# Altium footprint library Connectors - Terminal Blocks - Headers Plugs and Sockets.PcbLib: 19 footprints (part 1 of 2)
Each footprint in its own frame and in the unit in brackets; x right, y up, seen from the top. Pads: shape width x height; smd on the part's side, far side on the other; paste and mask are expansions set on the pad; w line width, h text height; cw(c..) or ccw(c..) is an arc to the next point about the centre after c.
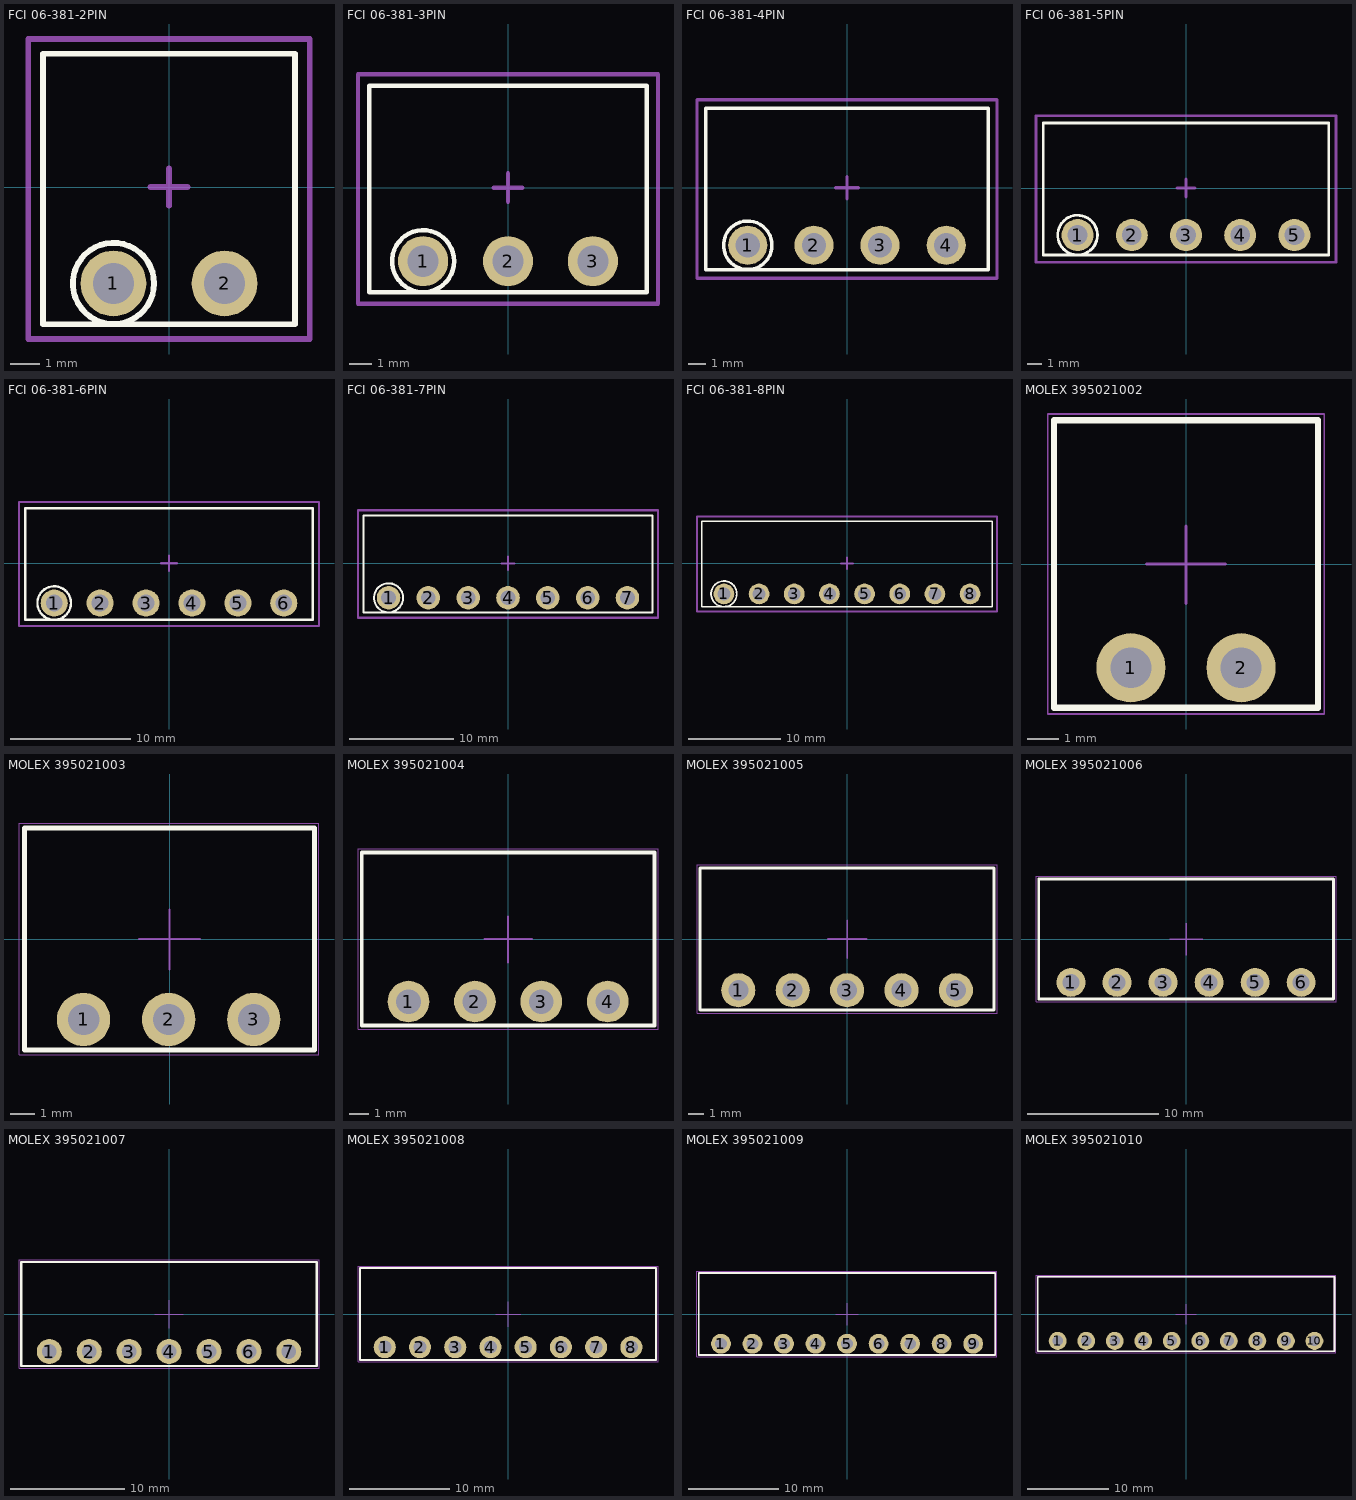
[diagram p0: the footprints below, top view; thin cyan lines are the x and y axes]

## FCI 06-381-2PIN [mm] "FCI Pluggable Terminal Block"
height 7
pads (2):
  round 2.25 hole 1.4: 1(-1.905,-3.302) 2(1.905,-3.302)
Top Overlay:
  circle w0.2: c-1.905,-3.302 r1.393
  lines w0.2: -4.318,-4.699 4.318,-4.699 4.318,4.572 -4.318,4.572 -4.318,-4.699
Mechanical 15:
  lines w0.2: -0.635,0 0.635,0 ; 0,-0.635 0,0.635 ; -4.826,-5.207 4.826,-5.207 4.826,5.08 -4.826,5.08 -4.826,-5.207
3D body "FCI 06-381 2Pos.STEP": height 7.6, standoff -3.52, extent -4.405,-4.699 4.405,4.501

## FCI 06-381-3PIN [mm] "FCI Pluggable Terminal Block"
height 7
pads (3):
  round 2.25 hole 1.4: 1(-3.81,-3.302) 2(0,-3.302) 3(3.81,-3.302)
Top Overlay:
  circle w0.2: c-3.81,-3.302 r1.393
  lines w0.2: -6.223,-4.699 -6.223,4.572 6.223,4.572 6.223,-4.699 -6.223,-4.699
Mechanical 15:
  lines w0.2: -0.635,0 0.635,0 ; 0,-0.635 0,0.635 ; -6.731,-5.207 -6.731,5.08 6.731,5.08 6.731,-5.207 -6.731,-5.207
3D body "FCI 06-381 3Pos.STEP": height 7.6, standoff -3.52, extent -6.31,-4.699 6.31,4.501

## FCI 06-381-4PIN [mm] "FCI Pluggable Terminal Block"
height 7
pads (4):
  round 2.25 hole 1.4: 1(-5.715,-3.302) 2(-1.905,-3.302) 3(1.905,-3.302) 4(5.715,-3.302)
Top Overlay:
  circle w0.2: c-5.715,-3.302 r1.393
  lines w0.2: -8.128,-4.699 -8.128,4.572 8.128,4.572 8.128,-4.699 -8.128,-4.699
Mechanical 15:
  lines w0.2: -0.635,0 0.635,0 ; 0,-0.635 0,0.635 ; -8.636,-5.207 -8.636,5.08 8.636,5.08 8.636,-5.207 -8.636,-5.207
3D body "FCI 06-381 4Pos.STEP": height 7.6, standoff -3.52, extent -8.215,-4.699 8.215,4.501

## FCI 06-381-5PIN [mm] "FCI Pluggable Terminal Block"
height 7
pads (5):
  round 2.25 hole 1.4: 1(-7.62,-3.302) 2(-3.81,-3.302) 3(0,-3.302) 4(3.81,-3.302) 5(7.62,-3.302)
Top Overlay:
  circle w0.2: c-7.62,-3.302 r1.393
  lines w0.2: -10.033,-4.699 10.033,-4.699 10.033,4.572 -10.033,4.572 -10.033,-4.699
Mechanical 15:
  lines w0.2: -0.635,0 0.635,0 ; 0,-0.635 0,0.635 ; -10.541,-5.207 10.541,-5.207 10.541,5.08 -10.541,5.08 -10.541,-5.207
3D body "FCI 06-381 5Pos.STEP": height 7.6, standoff -3.52, extent -10.12,-4.699 10.12,4.501

## FCI 06-381-6PIN [mm] "FCI Pluggable Terminal Block"
height 7
pads (6):
  round 2.25 hole 1.4: 1(-9.525,-3.302) 2(-5.715,-3.302) 3(-1.905,-3.302) 4(1.905,-3.302) 5(5.715,-3.302) 6(9.525,-3.302)
Top Overlay:
  circle w0.2: c-9.525,-3.302 r1.393
  lines w0.2: -11.938,-4.699 11.938,-4.699 11.938,4.572 -11.938,4.572 -11.938,-4.699
Mechanical 15:
  lines w0.2: -0.635,0 0.635,0 ; 0,-0.635 0,0.635 ; -12.446,-5.207 12.446,-5.207 12.446,5.08 -12.446,5.08 -12.446,-5.207
3D body "FCI 06-381 6Pos.STEP": height 7.6, standoff -3.52, extent -12.025,-4.699 12.025,4.501

## FCI 06-381-7PIN [mm] "FCI Pluggable Terminal Block"
height 7
pads (7):
  round 2.25 hole 1.4: 1(-11.43,-3.302) 2(-7.62,-3.302) 3(-3.81,-3.302) 4(0,-3.302) 5(3.81,-3.302) 6(7.62,-3.302) 7(11.43,-3.302)
Top Overlay:
  circle w0.2: c-11.43,-3.302 r1.393
  lines w0.2: -13.843,-4.699 -13.843,4.572 13.843,4.572 13.843,-4.699 -13.843,-4.699
Mechanical 15:
  lines w0.2: -0.635,0 0.635,0 ; 0,-0.635 0,0.635 ; -14.351,-5.207 -14.351,5.08 14.351,5.08 14.351,-5.207 -14.351,-5.207
3D body "FCI 06-381 7Pos.STEP": height 7.6, standoff -3.52, extent -13.93,-4.699 13.93,4.501

## FCI 06-381-8PIN [mm] "FCI Pluggable Terminal Block"
height 7
pads (8):
  round 2.25 hole 1.4: 1(-13.335,-3.302) 2(-9.525,-3.302) 3(-5.715,-3.302) 4(-1.905,-3.302) 5(1.905,-3.302) 6(5.715,-3.302) 7(9.525,-3.302) 8(13.335,-3.302)
Top Overlay:
  circle w0.2: c-13.335,-3.302 r1.393
  lines w0.2: -15.748,-4.699 15.748,-4.699 15.748,4.572 -15.748,4.572 -15.748,-4.699
Mechanical 15:
  lines w0.2: -0.635,0 0.635,0 ; 0,-0.635 0,0.635 ; -16.256,-5.207 16.256,-5.207 16.256,5.08 -16.256,5.08 -16.256,-5.207
3D body "FCI 06-381 8Pos.STEP": height 7.6, standoff -3.52, extent -15.835,-4.699 15.835,4.501

## MOLEX 395021002 [mil] "2 Position Terminal Block Header, Male Pins, 3.5mm Pitch,4.2x9.2mm Body, 90°, Right Angle, THT"
height 287.4
pads (2):
  round 86.61 hole 51: 1(-69,-130) 2(69,-130)
Top Overlay:
  lines w7.87: -165.35,-180 -165.35,180 165.35,180 165.35,-180 -165.35,-180
Mechanical 13:
  lines w3.94: -165.5,-180 165.35,-180 165.35,180 -165.5,180 ; -165.35,-180 -165.35,180
Mechanical 15:
  lines w1.97: -173.23,-187.87 -173.23,187.87 173.23,187.87 173.23,-187.87 -173.23,-187.87
  lines w3.94: -49.21,0 0,0 ; 0,-49.21 0,0 ; 0,47.24 0,0 ; 49.21,0 0,0
3D body "Molex - 395021002.step": height 280, standoff -140, extent -166,-180 166,180

## MOLEX 395021003 [mm] "3 Position Terminal Block Header, Male Pins, 3.5mm Pitch,11.94mmx9.2mm Body, 90°, Right Angle, THT"
height 7.3
pads (3):
  round 2.2 hole 1.295: 1(-3.542,-3.315) 2(-0.036,-3.315) 3(3.469,-3.315)
Top Overlay:
  lines w0.2: -5.969,-4.572 -5.969,4.572 5.969,4.572 5.969,-4.572 -5.969,-4.572
Mechanical 13:
  lines w0.1: -5.969,-4.572 5.969,-4.572 5.969,4.572 -5.969,4.572 -5.969,-4.572
Mechanical 15:
  lines w0.05: -6.2,-4.772 -6.2,4.772 6.157,4.772 6.157,-4.772 -6.2,-4.772
  lines w0.1: -1.25,0 0,0 ; 0,-1.25 0,0 ; 0,1.2 0,0 ; 1.25,0 0,0
3D body "Molex - 395021003 v1.step": height 7.11, standoff -3.56, extent -5.969,-4.572 5.969,4.572

## MOLEX 395021004 [mil] "4 Position Terminal Block Header, Male Pins, 3.5mm Pitch,15.44mmx9.2mm Body, 90°, Right Angle, THT"
height 287.4
pads (4):
  round 86.61 hole 51: 1(-207,-130) 2(-69,-130) 3(69,-130) 4(207,-130)
Top Overlay:
  lines w7.87: -304,-180 304,-180 304,180 -304,180 -304,-180
Mechanical 13:
  lines w3.94: -304,-180 -304,180 304,180 304,-180 -304,-180
Mechanical 15:
  lines w1.97: -311.89,-187.87 311.39,-187.87 311.39,187.87 -311.89,187.87 -311.89,-187.87
  lines w3.94: -49.21,0 0,0 ; 0,-49.21 0,0 ; 0,47.24 0,0 ; 49.21,0 0,0
3D body "Molex - 395021004 v1.step": height 280, standoff -140, extent -304,-180 304,180

## MOLEX 395021005 [mm] "5 Position Terminal Block Header, Male Pins, 3.5mm Pitch,18.95mmx9.2mm Body, 90°, Right Angle, THT"
height 7.3
pads (5):
  round 2.2 hole 1.295: 1(-7.011,-3.302) 2(-3.506,-3.302) 3(0,-3.302) 4(3.505,-3.302) 5(7.01,-3.302)
Top Overlay:
  lines w0.2: -9.474,-4.572 -9.474,4.572 9.475,4.572 9.475,-4.572 -9.474,-4.572
Mechanical 13:
  lines w0.1: -9.474,-4.572 9.475,-4.572 9.475,4.572 -9.474,4.572 -9.474,-4.572
Mechanical 15:
  lines w0.05: -9.674,-4.772 -9.674,4.772 9.662,4.772 9.662,-4.772 -9.674,-4.772
  lines w0.1: -1.25,0 0,0 ; 0,-1.25 0,0 ; 0,1.2 0,0 ; 1.25,0 0,0
3D body "Molex - 395021005 v1.step": height 7.11, standoff -3.56, extent -9.474,-4.572 9.475,4.572

## MOLEX 395021006 [mil] "6 Position Terminal Block Header, Male Pins, 3.5mm Pitch,22.45mmx9.2mm Body, 90°, Right Angle, THT"
height 287.4
pads (6):
  round 86.61 hole 51: 1(-345,-130) 2(-207,-130) 3(-69,-130) 4(69,-130) 5(207,-130) 6(345,-130)
Top Overlay:
  lines w7.87: -442,-180 442,-180 442,180 -442,180 -442,-180
Mechanical 13:
  lines w3.94: -442,-180 -442,180 442,180 442,-180 -442,-180
Mechanical 15:
  lines w1.97: -449.88,-187.87 449.39,-187.87 449.39,187.87 -449.88,187.87 -449.88,-187.87
  lines w3.94: -49.21,0 0,0 ; 0,-49.21 0,0 ; 0,47.24 0,0 ; 49.21,0 0,0
3D body "Molex - 395021006 v1.step": height 280, standoff -140, extent -442,-180 442,180

## MOLEX 395021007 [mil] "7 Position Terminal Block Header, Male Pins, 3.5mm Pitch,25.959mmx9.2mm Body, 90°, Right Angle, THT"
height 287.4
pads (7):
  round 86.61 hole 51: 1(-414,-130) 2(-276,-130) 3(-138,-130) 4(0,-130) 5(138,-130) 6(276,-130) 7(414,-130)
Top Overlay:
  lines w7.87: -511,-180 511,-180 511,180 -511,180 -511,-180
Mechanical 13:
  lines w3.94: -511,-180 -511,180 511,180 511,-180 -511,-180
Mechanical 15:
  lines w1.97: -518.86,-187.87 518.39,-187.87 518.39,187.87 -518.86,187.87 -518.86,-187.87
  lines w3.94: -49.21,0 0,0 ; 0,-49.21 0,0 ; 0,47.24 0,0 ; 49.21,0 0,0
3D body "Molex - 395021007 v1.step": height 280, standoff -140, extent -511,-180 511,180

## MOLEX 395021008 [mil] "8 Position Terminal Block Header, Male Pins, 3.5mm Pitch,29.46mmx9.2mm Body, 90°, Right Angle, THT"
height 287.4
pads (8):
  round 86.61 hole 51: 1(-483,-130) 2(-345,-130) 3(-207,-130) 4(-69,-130) 5(69,-130) 6(207,-130) 7(345,-130) 8(483,-130)
Top Overlay:
  lines w7.87: -580,-180 -580,180 580,180 580,-180 -580,-180
Mechanical 13:
  lines w3.94: -580,-180 580,-180 580,180 -580,180 -580,-180
Mechanical 15:
  lines w1.97: -587.87,-187.87 -587.87,187.87 587.39,187.87 587.39,-187.87 -587.87,-187.87
  lines w3.94: -49.21,0 0,0 ; 0,-49.21 0,0 ; 0,47.24 0,0 ; 49.21,0 0,0
3D body "Molex - 395021008 v1.step": height 280, standoff -140, extent -580,-180 580,180

## MOLEX 395021009 [mil] "9 Position Terminal Block Header, Male Pins, 3.5mm Pitch,32.97mmx9.2mm Body, 90°, Right Angle, THT"
height 287.4
pads (9):
  round 86.61 hole 51: 1(-552,-130) 2(-414,-130) 3(-276,-130) 4(-138,-130) 5(0,-130) 6(138,-130) 7(276,-130) 8(414,-130) 9(552,-130)
Top Overlay:
  lines w7.87: -649,-180 649,-180 649,180 -649,180 -649,-180
Mechanical 13:
  lines w3.94: -649,-180 -649,180 649,180 649,-180 -649,-180
Mechanical 15:
  lines w1.97: -656.89,-187.87 656.39,-187.87 656.39,187.87 -656.89,187.87 -656.89,-187.87
  lines w3.94: -49.21,0 0,0 ; 0,-49.21 0,0 ; 0,47.24 0,0 ; 49.21,0 0,0
3D body "Molex - 395021009 v1.step": height 280, standoff -140, extent -649,-180 649,180

## MOLEX 395021010 [mil] "10 Position Terminal Block Header, Male Pins, 3.5mm Pitch,36.47mmx9.2mm Body, 90°, Right Angle, THT"
height 287.4
pads (10):
  round 86.61 hole 51: 1(-621,-130) 2(-483,-130) 3(-345,-130) 4(-207,-130) 5(-69,-130) 6(69,-130) 7(207,-130) 8(345,-130) 9(483,-130) 10(621,-130)
Top Overlay:
  lines w7.87: -718,-180 718,-180 718,180 -718,180 -718,-180
Mechanical 13:
  lines w3.94: -718,-180 -718,180 718,180 718,-180 -718,-180
Mechanical 15:
  lines w1.97: -725.87,-187.87 725.39,-187.87 725.39,187.87 -725.87,187.87 -725.87,-187.87
  lines w3.94: -49.21,0 0,0 ; 0,-49.21 0,0 ; 0,47.24 0,0 ; 49.21,0 0,0
3D body "Molex - 395021010 v1.step": height 280, standoff -140, extent -718,-180 718,180